# Altium integrated library WS-DISV.intlib: 31 symbols
Pins are listed as number, name and electrical type; pins without a type are passive.

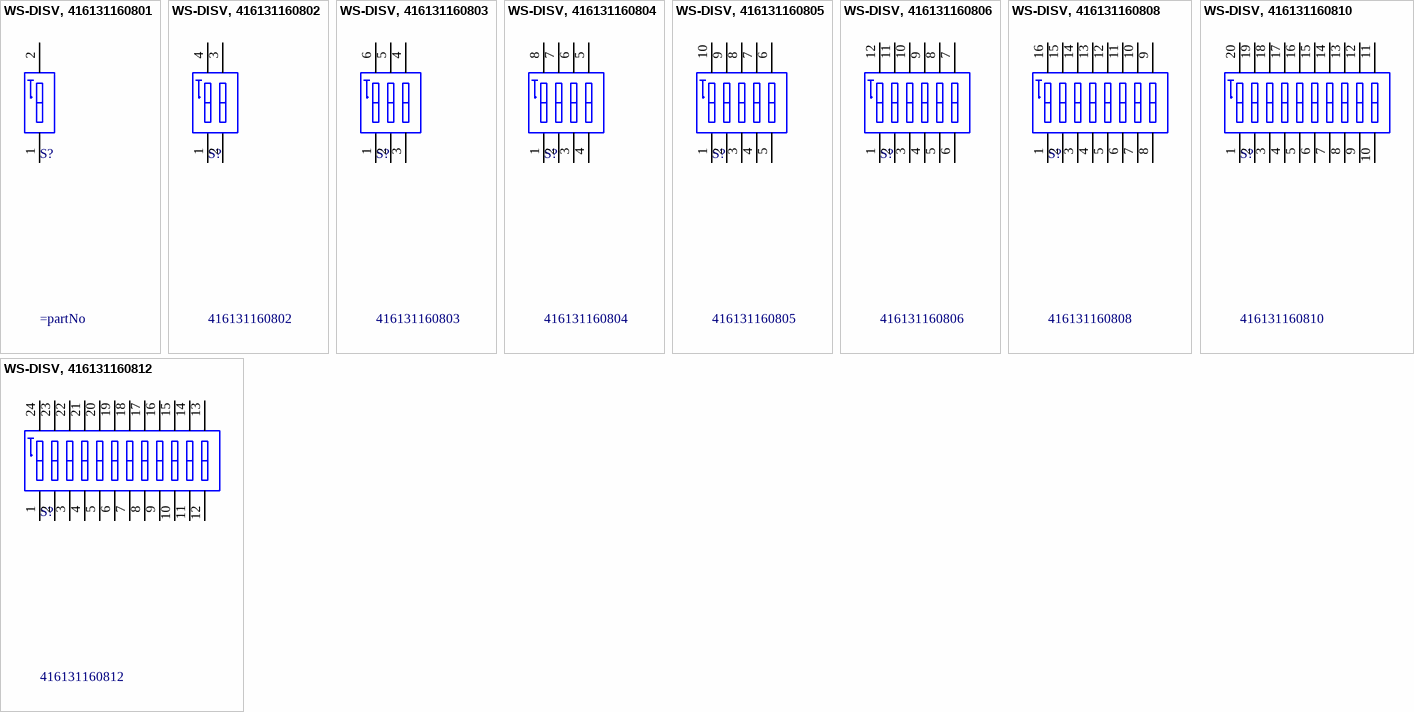
[diagram p0: symbols WS-DISV, 416131160801 to WS-DISV, 416131160812]

## WS-DISV, 416131160801
designator S?
WS-DISV 1.27 mm small compact SMD flat actuator with top tape; Manufacturer: Wurth Elektronik; Part No.: 418121160801; ComponentLink1 Description: Manufacturer; ComponentLink2 Description: Datasheet; Pole: 01; Created Date: Dec.2015; ComponentLink1URL: http://www.we-online.com; ComponentLink2URL: http://katalog.we-online.de/em/datasheet/4161311608xx.pdf; Created by: Baojun Chen
footprint 416131160801 (01p, 1.27mm Pitch, Horizontal, HP Type, SMT, flat Actuator, black, with Tape, T&R)
pins: 1, 2

## WS-DISV, 416131160802
designator S?, comment 416131160802
WS-DISV 1.27 mm small compact SMD flat actuator with top tape; Manufacturer: Wurth Elektronik; ComponentLink1 Description: Manufacturer; ComponentLink2 Description: Datasheet; Pole: 02; Created Date: Dec.2015; Part No.: 416131160802; ComponentLink1URL: http://www.we-online.com; ComponentLink2URL: http://katalog.we-online.de/em/datasheet/4161311608xx.pdf; Created by: Baojun Chen
footprint 416131160802 (02p, 1.27mm Pitch, Horizontal, HP Type, SMT, flat Actuator, black, with Tape, T&R)
pins: 1, 2, 3, 4

## WS-DISV, 416131160803
designator S?, comment 416131160803
WS-DISV 1.27 mm small compact SMD flat actuator with top tape; Manufacturer: Wurth Elektronik; ComponentLink1 Description: Manufacturer; ComponentLink2 Description: Datasheet; Pole: 03; Created Date: Dec.2015; Part No.: 416131160803; ComponentLink1URL: http://www.we-online.com; ComponentLink2URL: http://katalog.we-online.de/em/datasheet/4161311608xx.pdf; Created by: Baojun Chen
footprint 416131160803 (03p, 1.27mm Pitch, Horizontal, HP Type, SMT, flat Actuator, black, with Tape, T&R)
pins: 1, 2, 3, 4, 5, 6

## WS-DISV, 416131160804
designator S?, comment 416131160804
WS-DISV 1.27 mm small compact SMD flat actuator with top tape; Manufacturer: Wurth Elektronik; ComponentLink1 Description: Manufacturer; ComponentLink2 Description: Datasheet; Pole: 04; Created Date: Dec.2015; Part No.: 416131160804; ComponentLink1URL: http://www.we-online.com; ComponentLink2URL: http://katalog.we-online.de/em/datasheet/4161311608xx.pdf; Created by: Baojun Chen
footprint 416131160804 (04p, 1.27mm Pitch, Horizontal, HP Type, SMT, flat Actuator, black, with Tape, T&R)
pins: 1, 2, 3, 4, 5, 6, 7, 8

## WS-DISV, 416131160805
designator S?, comment 416131160805
WS-DISV 1.27 mm small compact SMD flat actuator with top tape; Manufacturer: Wurth Elektronik; ComponentLink1 Description: Manufacturer; ComponentLink2 Description: Datasheet; Pole: 05; Created Date: Dec.2015; Part No.: 416131160805; ComponentLink1URL: http://www.we-online.com; ComponentLink2URL: http://katalog.we-online.de/em/datasheet/4161311608xx.pdf; Created by: Baojun Chen
footprint 416131160805 (05p, 1.27mm Pitch, Horizontal, HP Type, SMT, flat Actuator, black, with Tape, T&R)
pins: 1, 2, 3, 4, 5, 6, 7, 8, 9, 10

## WS-DISV, 416131160806
designator S?, comment 416131160806
WS-DISV 1.27 mm small compact SMD flat actuator with top tape; Manufacturer: Wurth Elektronik; ComponentLink1 Description: Manufacturer; ComponentLink2 Description: Datasheet; Pole: 06; Created Date: Dec.2015; Part No.: 416131160806; ComponentLink1URL: http://www.we-online.com; ComponentLink2URL: http://katalog.we-online.de/em/datasheet/4161311608xx.pdf; Created by: Baojun Chen
footprint 416131160806 (06p, 1.27mm Pitch, Horizontal, HP Type, SMT, flat Actuator, black, with Tape, T&R)
pins: 1, 2, 3, 4, 5, 6, 7, 8, 9, 10, 11, 12

## WS-DISV, 416131160808
designator S?, comment 416131160808
WS-DISV 1.27 mm small compact SMD flat actuator with top tape; Manufacturer: Wurth Elektronik; ComponentLink1 Description: Manufacturer; ComponentLink2 Description: Datasheet; Pole: 08; Created Date: Dec.2015; Part No.: 416131160808; ComponentLink1URL: http://www.we-online.com; ComponentLink2URL: http://katalog.we-online.de/em/datasheet/4161311608xx.pdf; Created by: Baojun Chen
footprint 416131160808 (08p, 1.27mm Pitch, Horizontal, HP Type, SMT, flat Actuator, black, with Tape, T&R)
pins: 1, 2, 3, 4, 5, 6, 7, 8, 9, 10, 11, 12, 13, 14, 15, 16

## WS-DISV, 416131160810
designator S?, comment 416131160810
WS-DISV 1.27 mm small compact SMD flat actuator with top tape; Manufacturer: Wurth Elektronik; ComponentLink1 Description: Manufacturer; ComponentLink2 Description: Datasheet; Pole: 10; Created Date: Dec.2015; Part No.: 416131160810; ComponentLink1URL: http://www.we-online.com; ComponentLink2URL: http://katalog.we-online.de/em/datasheet/4161311608xx.pdf; Created by: Baojun Chen
footprint 416131160810 (10p, 1.27mm Pitch, Horizontal, HP Type, SMT, flat Actuator, black, with Tape, T&R)
pins: 1, 2, 3, 4, 5, 6, 7, 8, 9, 10, 11, 12, 13, 14, 15, 16, 17, 18, 19, 20

## WS-DISV, 416131160812
designator S?, comment 416131160812
WS-DISV 1.27 mm small compact SMD flat actuator with top tape; Manufacturer: Wurth Elektronik; ComponentLink1 Description: Manufacturer; ComponentLink2 Description: Datasheet; Pole: 12; Created Date: Dec.2015; Part No.: 416131160812; ComponentLink1URL: http://www.we-online.com; ComponentLink2URL: http://katalog.we-online.de/em/datasheet/4161311608xx.pdf; Created by: Baojun Chen
footprint 416131160812 (12p, 1.27mm Pitch, Horizontal, HP Type, SMT, flat Actuator, black, with Tape, T&R)
pins: 1, 2, 3, 4, 5, 6, 7, 8, 9, 10, 11, 12, 13, 14, 15, 16, 17, 18, 19, 20, 21, 22, 23, 24


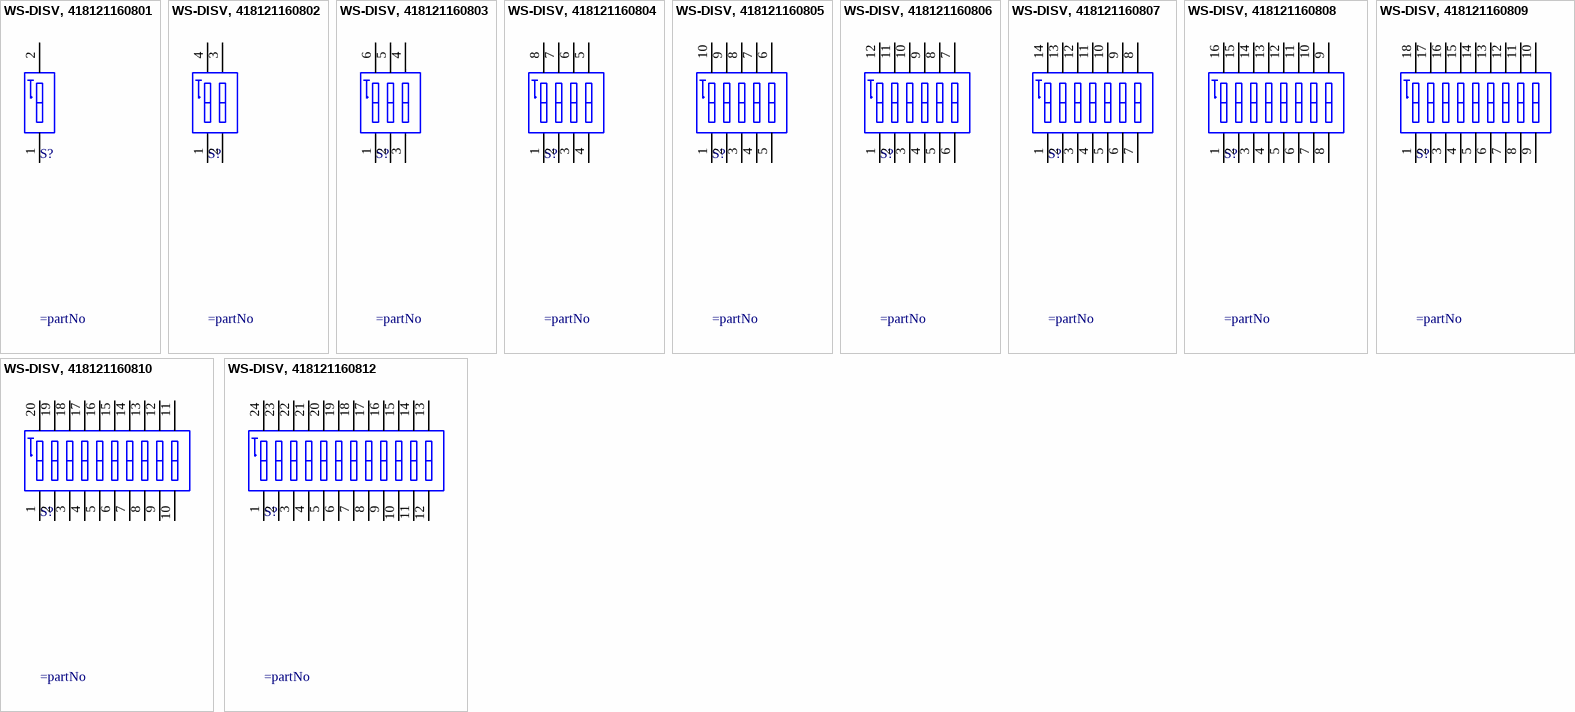
[diagram p1: symbols WS-DISV, 418121160801 to WS-DISV, 418121160812]

## WS-DISV, 418121160801
designator S?
WS-DISV 2.54 mm small compact SMD flat actuator with top tape; Manufacturer: Wurth Elektronik; Part No.: 418121160801; ComponentLink1 Description: Manufacturer; ComponentLink2 Description: Datasheet; Pole: 01; Created Date: Dec.2015; ComponentLink1URL: http://www.we-online.com; ComponentLink2URL: http://katalog.we-online.de/em/datasheet/4181211608xx.pdf; Created by: Baojun Chen
footprint 418121160801 (01p, 2.54mm Pitch, Horizontal, IC Type, SMT, flat Actuator, black, with Tape, T&R)
pins: 1, 2

## WS-DISV, 418121160802
designator S?
WS-DISV 2.54 mm small compact SMD flat actuator with top tape; Manufacturer: Wurth Elektronik; Part No.: 418121160802; ComponentLink1 Description: Manufacturer; ComponentLink2 Description: Datasheet; Pole: 02; Created Date: Dec.2015; ComponentLink1URL: http://www.we-online.com; ComponentLink2URL: http://katalog.we-online.de/em/datasheet/4181211608xx.pdf; Created by: Baojun Chen
footprint 418121160802 (02p, 2.54mm Pitch, Horizontal, IC Type, SMT, flat Actuator, black, with Tape, T&R)
pins: 1, 2, 3, 4

## WS-DISV, 418121160803
designator S?
WS-DISV 2.54 mm small compact SMD flat actuator with top tape; Manufacturer: Wurth Elektronik; Part No.: 418121160803; ComponentLink1 Description: Manufacturer; ComponentLink2 Description: Datasheet; Pole: 03; Created Date: Dec.2015; ComponentLink1URL: http://www.we-online.com; ComponentLink2URL: http://katalog.we-online.de/em/datasheet/4181211608xx.pdf; Created by: Baojun Chen
footprint 418121160803 (03p, 2.54mm Pitch, Horizontal, IC Type, SMT, flat Actuator, black, with Tape, T&R)
pins: 1, 2, 3, 4, 5, 6

## WS-DISV, 418121160804
designator S?
WS-DISV 2.54 mm small compact SMD flat actuator with top tape; Manufacturer: Wurth Elektronik; Part No.: 418121160804; ComponentLink1 Description: Manufacturer; ComponentLink2 Description: Datasheet; Pole: 04; Created Date: Dec.2015; ComponentLink1URL: http://www.we-online.com; ComponentLink2URL: http://katalog.we-online.de/em/datasheet/4181211608xx.pdf; Created by: Baojun Chen
footprint 418121160804 (04p, 2.54mm Pitch, Horizontal, IC Type, SMT, flat Actuator, black, with Tape, T&R)
pins: 1, 2, 3, 4, 5, 6, 7, 8

## WS-DISV, 418121160805
designator S?
WS-DISV 2.54 mm small compact SMD flat actuator with top tape; Manufacturer: Wurth Elektronik; Part No.: 418121160805; ComponentLink1 Description: Manufacturer; ComponentLink2 Description: Datasheet; Pole: 05; Created Date: Dec.2015; ComponentLink1URL: http://www.we-online.com; ComponentLink2URL: http://katalog.we-online.de/em/datasheet/4181211608xx.pdf; Created by: Baojun Chen
footprint 418121160805 (05p, 2.54mm Pitch, Horizontal, IC Type, SMT, flat Actuator, black, with Tape, T&R)
pins: 1, 2, 3, 4, 5, 6, 7, 8, 9, 10

## WS-DISV, 418121160806
designator S?
WS-DISV 2.54 mm small compact SMD flat actuator with top tape; Manufacturer: Wurth Elektronik; Part No.: 418121160806; ComponentLink1 Description: Manufacturer; ComponentLink2 Description: Datasheet; Pole: 06; Created Date: Dec.2015; ComponentLink1URL: http://www.we-online.com; ComponentLink2URL: http://katalog.we-online.de/em/datasheet/4181211608xx.pdf; Created by: Baojun Chen
footprint 418121160806 (06p, 2.54mm Pitch, Horizontal, IC Type, SMT, flat Actuator, black, with Tape, T&R)
pins: 1, 2, 3, 4, 5, 6, 7, 8, 9, 10, 11, 12

## WS-DISV, 418121160807
designator S?
WS-DISV 2.54 mm small compact SMD flat actuator with top tape; Manufacturer: Wurth Elektronik; Part No.: 418121160807; ComponentLink1 Description: Manufacturer; ComponentLink2 Description: Datasheet; Pole: 07; Created Date: Dec.2015; ComponentLink1URL: http://www.we-online.com; ComponentLink2URL: http://katalog.we-online.de/em/datasheet/4181211608xx.pdf; Created by: Baojun Chen
footprint 418121160807 (07p, 2.54mm Pitch, Horizontal, IC Type, SMT, flat Actuator, black, with Tape, T&R)
pins: 1, 2, 3, 4, 5, 6, 7, 8, 9, 10, 11, 12, 13, 14

## WS-DISV, 418121160808
designator S?
WS-DISV 2.54 mm small compact SMD flat actuator with top tape; Manufacturer: Wurth Elektronik; Part No.: 418121160808; ComponentLink1 Description: Manufacturer; ComponentLink2 Description: Datasheet; Pole: 08; Created Date: Dec.2015; ComponentLink1URL: http://www.we-online.com; ComponentLink2URL: http://katalog.we-online.de/em/datasheet/4181211608xx.pdf; Created by: Baojun Chen
footprint 418121160808 (08p, 2.54mm Pitch, Horizontal, IC Type, SMT, flat Actuator, black, with Tape, T&R)
pins: 1, 2, 3, 4, 5, 6, 7, 8, 9, 10, 11, 12, 13, 14, 15, 16

## WS-DISV, 418121160809
designator S?
WS-DISV 2.54 mm small compact SMD flat actuator with top tape; Manufacturer: Wurth Elektronik; Part No.: 418121160809; ComponentLink1 Description: Manufacturer; ComponentLink2 Description: Datasheet; Pole: 09; Created Date: Dec.2015; ComponentLink1URL: http://www.we-online.com; ComponentLink2URL: http://katalog.we-online.de/em/datasheet/4181211608xx.pdf; Created by: Baojun Chen
footprint 418121160809 (09p, 2.54mm Pitch, Horizontal, IC Type, SMT, flat Actuator, black, with Tape, T&R)
pins: 1, 2, 3, 4, 5, 6, 7, 8, 9, 10, 11, 12, 13, 14, 15, 16, 17, 18

## WS-DISV, 418121160810
designator S?
WS-DISV 2.54 mm small compact SMD flat actuator with top tape; Manufacturer: Wurth Elektronik; Part No.: 418121160810; ComponentLink1 Description: Manufacturer; ComponentLink2 Description: Datasheet; Pole: 10; Created Date: Dec.2015; ComponentLink1URL: http://www.we-online.com; ComponentLink2URL: http://katalog.we-online.de/em/datasheet/4181211608xx.pdf; Created by: Baojun Chen
footprint 418121160810 (10p, 2.54mm Pitch, Horizontal, IC Type, SMT, flat Actuator, black, with Tape, T&R)
pins: 1, 2, 3, 4, 5, 6, 7, 8, 9, 10, 11, 12, 13, 14, 15, 16, 17, 18, 19, 20

## WS-DISV, 418121160812
designator S?
WS-DISV 2.54 mm small compact SMD flat actuator with top tape; Manufacturer: Wurth Elektronik; Part No.: 418121160812; ComponentLink1 Description: Manufacturer; ComponentLink2 Description: Datasheet; Pole: 12; Created Date: Dec.2015; ComponentLink1URL: http://www.we-online.com; ComponentLink2URL: http://katalog.we-online.de/em/datasheet/4181211608xx.pdf; Created by: Baojun Chen
footprint 418121160812 (12p, 2.54mm Pitch, Horizontal, IC Type, SMT, flat Actuator, black, with Tape, T&R)
pins: 1, 2, 3, 4, 5, 6, 7, 8, 9, 10, 11, 12, 13, 14, 15, 16, 17, 18, 19, 20, 21, 22, 23, 24


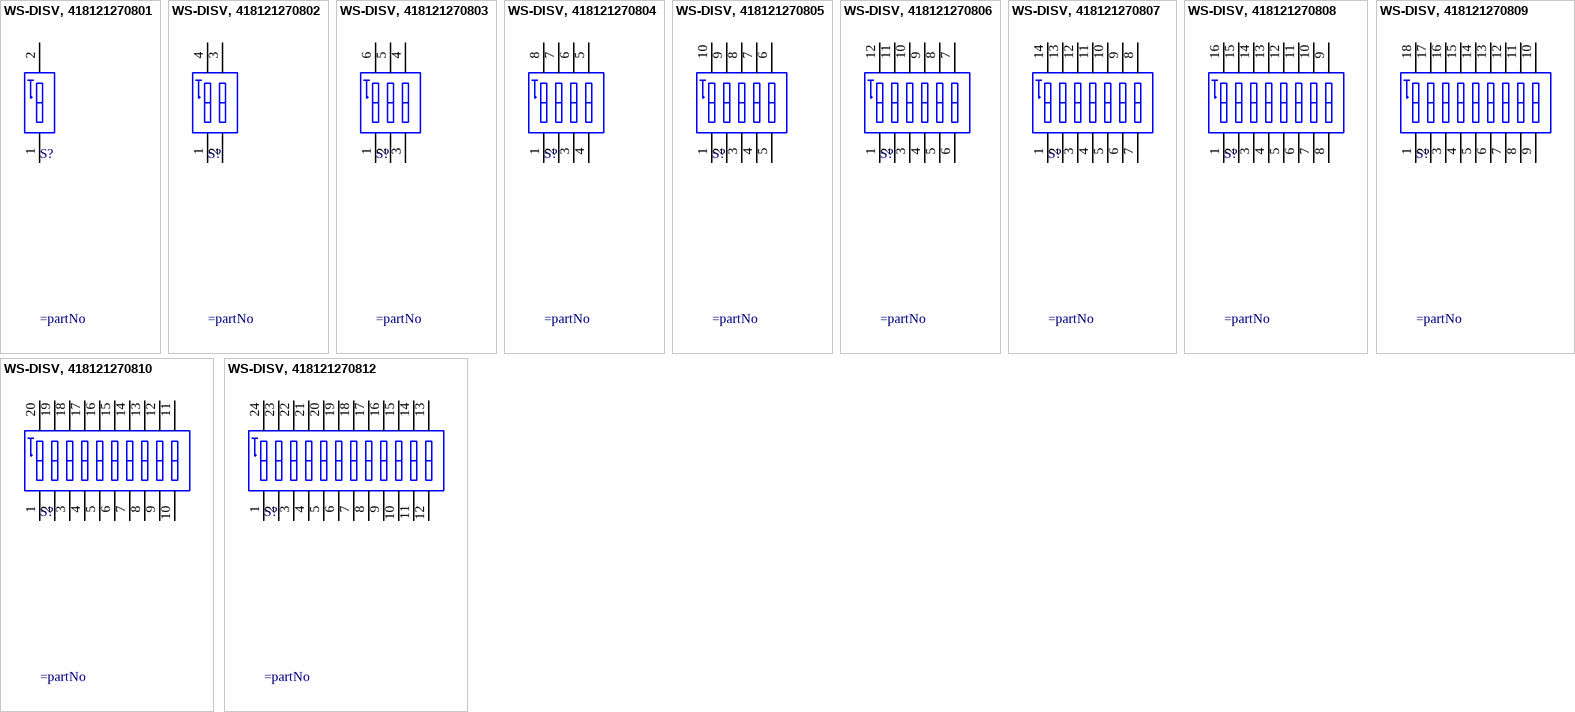
[diagram p2: symbols WS-DISV, 418121270801 to WS-DISV, 418121270812]

## WS-DISV, 418121270801
designator S?
WS-DISV 2.54 mm small compact SMD with raised actuator; Manufacturer: Wurth Elektronik; Part No.: 418121270801; ComponentLink1 Description: Manufacturer; ComponentLink2 Description: Datasheet; Pole: 01; Created Date: Dec.2015; ComponentLink1URL: http://www.we-online.com; ComponentLink2URL: http://katalog.we-online.de/em/datasheet/4181212708xx.pdf; Created by: Baojun Chen
footprint 418121270801 (01p, 2.54mm Pitch, Horizontal, IC Type, SMT, raised Actuator, black, without Tape, T&R)
pins: 1, 2

## WS-DISV, 418121270802
designator S?
WS-DISV 2.54 mm small compact SMD with raised actuator; Manufacturer: Wurth Elektronik; Part No.: 418121270802; ComponentLink1 Description: Manufacturer; ComponentLink2 Description: Datasheet; Pole: 02; Created Date: Dec.2015; ComponentLink1URL: http://www.we-online.com; ComponentLink2URL: http://katalog.we-online.de/em/datasheet/4181212708xx.pdf; Created by: Baojun Chen
footprint 418121270802 (02p, 2.54mm Pitch, Horizontal, IC Type, SMT, raised Actuator, black, without Tape, T&R)
pins: 1, 2, 3, 4

## WS-DISV, 418121270803
designator S?
WS-DISV 2.54 mm small compact SMD with raised actuator; Manufacturer: Wurth Elektronik; Part No.: 418121270803; ComponentLink1 Description: Manufacturer; ComponentLink2 Description: Datasheet; Pole: 03; Created Date: Dec.2015; ComponentLink1URL: http://www.we-online.com; ComponentLink2URL: http://katalog.we-online.de/em/datasheet/4181212708xx.pdf; Created by: Baojun Chen
footprint 418121270803 (03p, 2.54mm Pitch, Horizontal, IC Type, SMT, raised Actuator, black, without Tape, T&R)
pins: 1, 2, 3, 4, 5, 6

## WS-DISV, 418121270804
designator S?
WS-DISV 2.54 mm small compact SMD with raised actuator; Manufacturer: Wurth Elektronik; Part No.: 418121270804; ComponentLink1 Description: Manufacturer; ComponentLink2 Description: Datasheet; Pole: 04; Created Date: Dec.2015; ComponentLink1URL: http://www.we-online.com; ComponentLink2URL: http://katalog.we-online.de/em/datasheet/4181212708xx.pdf; Created by: Baojun Chen
footprint 418121270804 (04p, 2.54mm Pitch, Horizontal, IC Type, SMT, raised Actuator, black, without Tape, T&R)
pins: 1, 2, 3, 4, 5, 6, 7, 8

## WS-DISV, 418121270805
designator S?
WS-DISV 2.54 mm small compact SMD with raised actuator; Manufacturer: Wurth Elektronik; Part No.: 418121270805; ComponentLink1 Description: Manufacturer; ComponentLink2 Description: Datasheet; Pole: 05; Created Date: Dec.2015; ComponentLink1URL: http://www.we-online.com; ComponentLink2URL: http://katalog.we-online.de/em/datasheet/4181212708xx.pdf; Created by: Baojun Chen
footprint 418121270805 (05p, 2.54mm Pitch, Horizontal, IC Type, SMT, raised Actuator, black, without Tape, T&R)
pins: 1, 2, 3, 4, 5, 6, 7, 8, 9, 10

## WS-DISV, 418121270806
designator S?
WS-DISV 2.54 mm small compact SMD with raised actuator; Manufacturer: Wurth Elektronik; Part No.: 418121270806; ComponentLink1 Description: Manufacturer; ComponentLink2 Description: Datasheet; Pole: 06; Created Date: Dec.2015; ComponentLink1URL: http://www.we-online.com; ComponentLink2URL: http://katalog.we-online.de/em/datasheet/4181212708xx.pdf; Created by: Baojun Chen
footprint 418121270806 (06p, 2.54mm Pitch, Horizontal, IC Type, SMT, raised Actuator, black, without Tape, T&R)
pins: 1, 2, 3, 4, 5, 6, 7, 8, 9, 10, 11, 12

## WS-DISV, 418121270807
designator S?
WS-DISV 2.54 mm small compact SMD with raised actuator; Manufacturer: Wurth Elektronik; Part No.: 418121270807; ComponentLink1 Description: Manufacturer; ComponentLink2 Description: Datasheet; Pole: 07; Created Date: Dec.2015; ComponentLink1URL: http://www.we-online.com; ComponentLink2URL: http://katalog.we-online.de/em/datasheet/4181212708xx.pdf; Created by: Baojun Chen
footprint 418121270807 (07p, 2.54mm Pitch, Horizontal, IC Type, SMT, raised Actuator, black, without Tape, T&R)
pins: 1, 2, 3, 4, 5, 6, 7, 8, 9, 10, 11, 12, 13, 14

## WS-DISV, 418121270808
designator S?
WS-DISV 2.54 mm small compact SMD with raised actuator; Manufacturer: Wurth Elektronik; Part No.: 418121270808; ComponentLink1 Description: Manufacturer; ComponentLink2 Description: Datasheet; Pole: 08; Created Date: Dec.2015; ComponentLink1URL: http://www.we-online.com; ComponentLink2URL: http://katalog.we-online.de/em/datasheet/4181212708xx.pdf; Created by: Baojun Chen
footprint 418121270808 (08p, 2.54mm Pitch, Horizontal, IC Type, SMT, raised Actuator, black, without Tape, T&R)
pins: 1, 2, 3, 4, 5, 6, 7, 8, 9, 10, 11, 12, 13, 14, 15, 16

## WS-DISV, 418121270809
designator S?
WS-DISV 2.54 mm small compact SMD with raised actuator; Manufacturer: Wurth Elektronik; Part No.: 418121270809; ComponentLink1 Description: Manufacturer; ComponentLink2 Description: Datasheet; Pole: 09; Created Date: Dec.2015; ComponentLink1URL: http://www.we-online.com; ComponentLink2URL: http://katalog.we-online.de/em/datasheet/4181212708xx.pdf; Created by: Baojun Chen
footprint 418121270809 (09p, 2.54mm Pitch, Horizontal, IC Type, SMT, raised Actuator, black, without Tape, T&R)
pins: 1, 2, 3, 4, 5, 6, 7, 8, 9, 10, 11, 12, 13, 14, 15, 16, 17, 18

## WS-DISV, 418121270810
designator S?
WS-DISV 2.54 mm small compact SMD with raised actuator; Manufacturer: Wurth Elektronik; Part No.: 418121270810; ComponentLink1 Description: Manufacturer; ComponentLink2 Description: Datasheet; Pole: 10; Created Date: Dec.2015; ComponentLink1URL: http://www.we-online.com; ComponentLink2URL: http://katalog.we-online.de/em/datasheet/4181212708xx.pdf; Created by: Baojun Chen
footprint 418121270810 (10p, 2.54mm Pitch, Horizontal, IC Type, SMT, raised Actuator, black, without Tape, T&R)
pins: 1, 2, 3, 4, 5, 6, 7, 8, 9, 10, 11, 12, 13, 14, 15, 16, 17, 18, 19, 20

## WS-DISV, 418121270812
designator S?
WS-DISV 2.54 mm small compact SMD with raised actuator; Manufacturer: Wurth Elektronik; Part No.: 418121270812; ComponentLink1 Description: Manufacturer; ComponentLink2 Description: Datasheet; Pole: 12; Created Date: Dec.2015; ComponentLink1URL: http://www.we-online.com; ComponentLink2URL: http://katalog.we-online.de/em/datasheet/4181212708xx.pdf; Created by: Baojun Chen
footprint 418121270812 (12p, 2.54mm Pitch, Horizontal, IC Type, SMT, raised Actuator, black, without Tape, T&R)
pins: 1, 2, 3, 4, 5, 6, 7, 8, 9, 10, 11, 12, 13, 14, 15, 16, 17, 18, 19, 20, 21, 22, 23, 24